# Altium footprint library ICL_komponenty_v1.PcbLib: 160 footprints (part 3 of 10)
Each footprint in its own frame and in the unit in brackets; x right, y up, seen from the top. Pads: shape width x height; smd on the part's side, far side on the other; paste and mask are expansions set on the pad; w line width, h text height; cw(c..) or ccw(c..) is an arc to the next point about the centre after c.
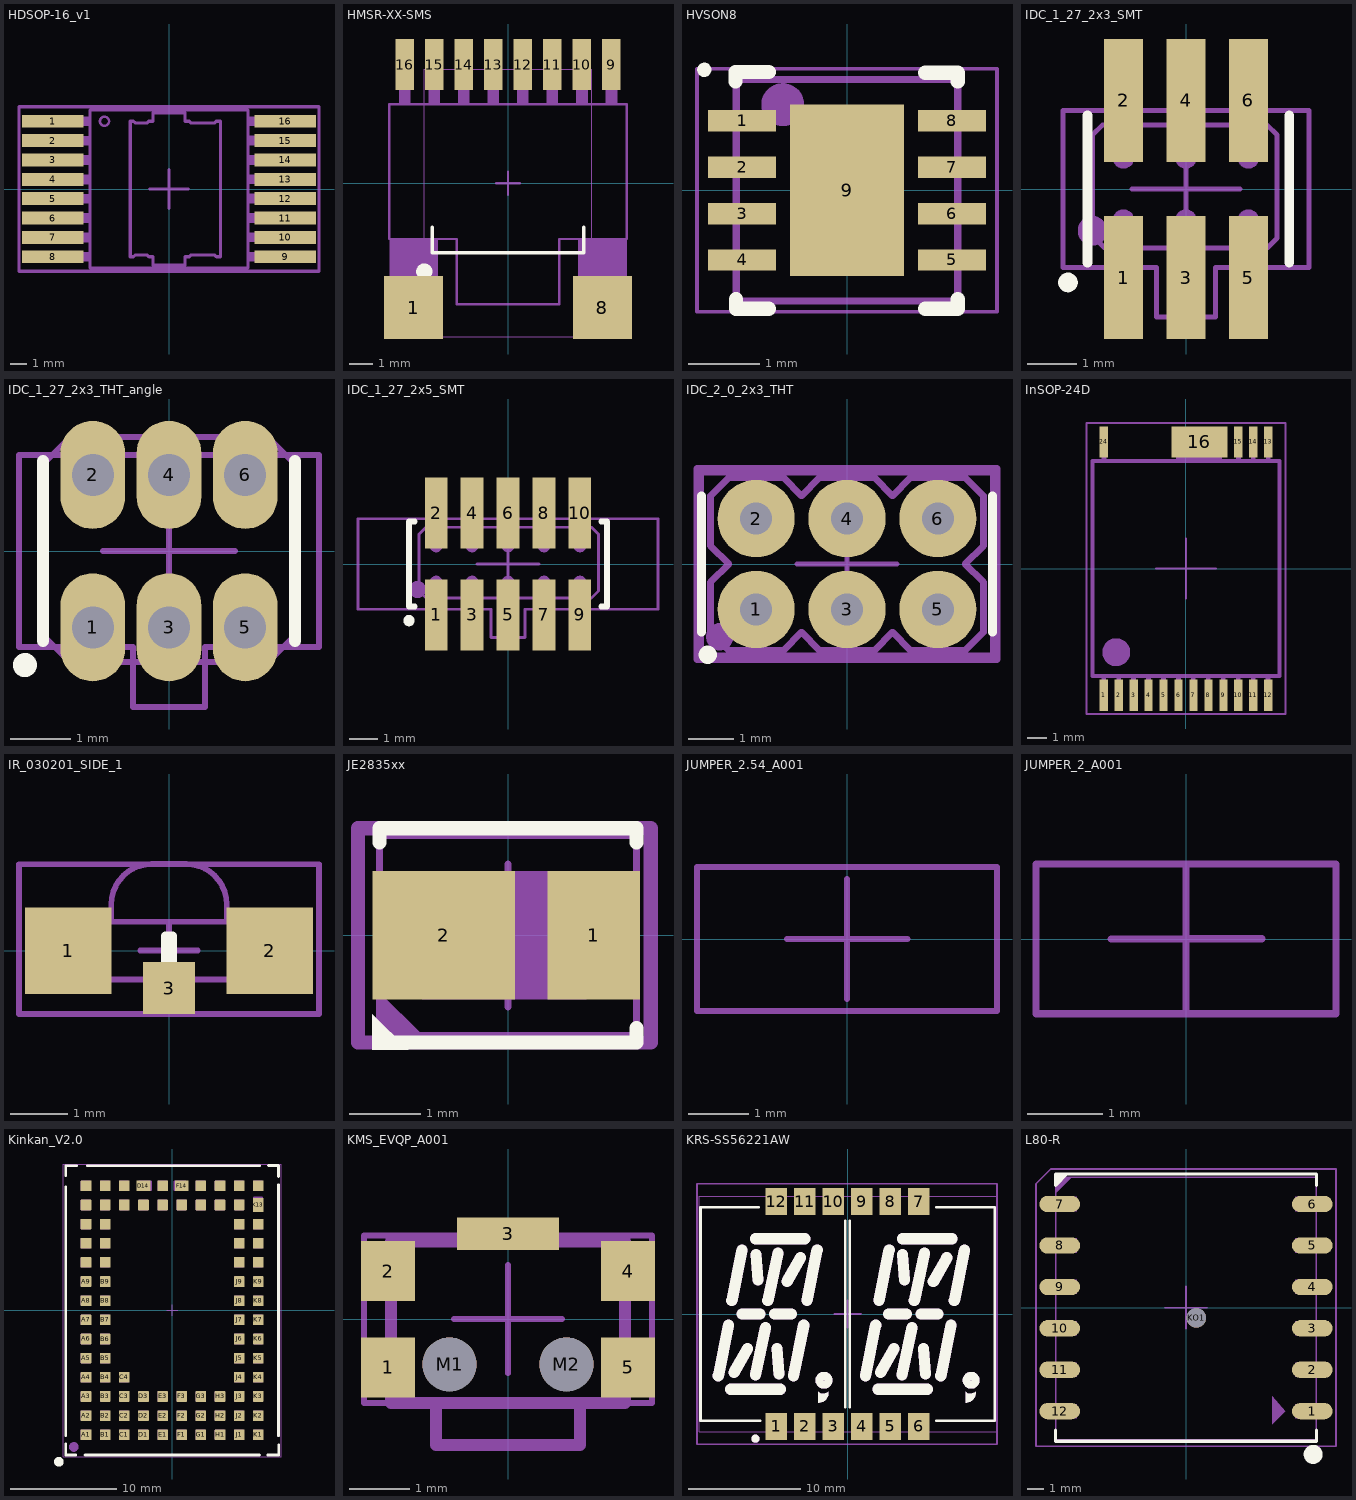
[diagram p2: the footprints below, top view; thin cyan lines are the x and y axes]

## HDSOP-16_v1 [mm] "infinion"
pads (16):
  rect 3.8x0.8 smd: 1(-7.2,4.2) 2(-7.2,3) 3(-7.2,1.8) 4(-7.2,0.6) 5(-7.2,-0.6) 6(-7.2,-1.8) 7(-7.2,-3) 8(-7.2,-4.2) 9(7.2,-4.2) 10(7.2,-3) 11(7.2,-1.8) 12(7.2,-0.6) 13(7.2,0.6) 14(7.2,1.8) 15(7.2,3) 16(7.2,4.2)
Top M11-12_SMOT:
  circle w0.15: c-4,4.2 r0.283
  region: 7.5,4.507 4.9,4.507 4.9,3.9 7.5,3.9
  region: 7.5,3.307 4.9,3.307 4.9,2.7 7.5,2.7
  region: 7.5,2.107 4.9,2.107 4.9,1.5 7.5,1.5
  region: 7.5,0.907 4.9,0.907 4.9,0.3 7.5,0.3
  region: 7.5,-0.293 4.9,-0.293 4.9,-0.9 7.5,-0.9
  region: 7.5,-1.493 4.9,-1.493 4.9,-2.1 7.5,-2.1
  region: 7.5,-2.693 4.9,-2.693 4.9,-3.3 7.5,-3.3
  region: 7.5,-3.893 4.9,-3.893 4.9,-4.5 7.5,-4.5
  rectangle: -7.5,-4.507 -4.9,-3.9
  rectangle: -7.5,-3.307 -4.9,-2.7
  rectangle: -7.5,-2.107 -4.9,-1.5
  rectangle: -7.5,-0.907 -4.9,-0.3
  rectangle: -7.5,0.293 -4.9,0.9
  rectangle: -7.5,1.493 -4.9,2.1
  rectangle: -7.5,2.693 -4.9,3.3
  rectangle: -7.5,3.893 -4.9,4.5
  lines w0.2: -4.9,-4.9 -4.9,4.9 4.9,4.9 4.9,-4.9 -4.9,-4.9 ; -2.4,-4.2 -2.207,-4.2 -2.107,-4.1 -1.347,-4.1 -1.247,-4.2 -1,-4.2 -1,-4.73 1,-4.73 1,-4.2 1.251,-4.2 1.351,-4.1 2.84,-4.1 2.94,-4.2 3.2,-4.2 3.2,4.2 2.933,4.2 2.833,4.1 1.352,4.1 1.252,4.2 1,4.2 1,4.73 -1,4.73 -1,4.2 -1.252,4.2 -1.352,4.1 -2.1,4.1 -2.2,4.2 -2.4,4.2 -2.4,-4.2
Top M15-16_SORG:
  lines w0.2: -1.2,0 0,0 ; 0,-1.2 0,0 ; 0,1.2 0,0 ; 1.2,0 0,0 ; -9.3,-5.1 -9.3,5.1 9.3,5.1 9.3,-5.1 -9.3,-5.1
3D body "PG-HDSOP-16-1.stp": height 2.21, standoff -0.15, extent -7.5,-4.95 7.5,4.95

## HMSR-XX-SMS [mm] "LEM CS"
height 2.39
pads (10):
  rect 2.54x2.7 smd: 1(-4.06,-5.35) 8(4.06,-5.35)
  rect 0.8x2.2 smd: 9(4.445,5.1) 10(3.175,5.1) 11(1.905,5.1) 12(0.635,5.1) 13(-0.635,5.1) 14(-1.905,5.1) 15(-3.175,5.1) 16(-4.445,5.1)
Top Overlay:
  circle w0.35: c-3.6,-3.8 r0.172
  lines w0.152: -3.25,-1.9 -3.25,-3 3.25,-3 3.25,-1.9
Top M11-12_SMOT:
  rectangle: -5.1,-5.1 -3,-2.4
  rectangle: 4.2,3.4 4.7,5.7
  rectangle: 3.02,-5.1 5.12,-2.4
  rectangle: 2.93,3.4 3.43,5.7
  rectangle: 1.66,3.4 2.16,5.7
  rectangle: 0.39,3.4 0.89,5.7
  rectangle: -0.88,3.4 -0.38,5.7
  rectangle: -2.15,3.4 -1.65,5.7
  rectangle: -3.42,3.4 -2.92,5.7
  rectangle: -4.69,3.4 -4.19,5.7
  lines w0.1: -5.1,-2.4 -5.1,3.4 5.1,3.4 5.1,-2.4 2.2,-2.4 2.2,-5.2 0,-5.2 -2.2,-5.2 -2.2,-2.4 -5.1,-2.4
Top M13-14_SDES:
  text "'.Designator'" at -6.165,1.483 h1
Top M15-16_SORG:
  lines w0.05: -3.6,-6.6 3.6,-6.6 3.6,4.9 -3.6,4.9 -3.6,-6.6
  lines w0.1: -0.5,0 0.5,0 ; 0,-0.5 0,0.5
3D body "HMSR-SMS.stp": height 6.46, standoff 0.01, extent -5.16,-6.48 5.16,5.65

## HVSON8 [mm] "SON, 8-Leads, Body 3,00x3,00mm, Pitch 0,65mm, Thermal Pad 2,40x1,59mm, IPC Low Density"
height 1
pads (9):
  rect 0.95x0.3 smd: 1(-1.47,0.975) 2(-1.47,0.325) 3(-1.47,-0.325) 4(-1.47,-0.975) 5(1.47,-0.975) 6(1.47,-0.325) 7(1.47,0.325) 8(1.47,0.975)
  rect 1.59x2.4 smd: 9(0,0)
Top Overlay:
  circle w0.1: c-1.998,1.688 r0.05
  lines w0.2: -1.56,1.525 -1.56,1.657 -1.095,1.657 ; -1.555,-1.525 -1.555,-1.658 -1.095,-1.658 ; 1.095,-1.658 1.551,-1.658 1.551,-1.525 ; 1.095,1.647 1.552,1.647 1.552,1.525
Top M11-12_SMOT:
  circle w0.3: c-0.9,1.2 r0.15
  rectangle: -1.632,0.857 -1.03,1.1
  rectangle: -1.632,0.207 -1.03,0.45
  rectangle: -1.632,-0.443 -1.03,-0.2
  rectangle: -1.632,-1.093 -1.03,-0.85
  region: 1.632,-0.857 1.03,-0.857 1.03,-1.1 1.632,-1.1
  region: 1.632,-0.207 1.03,-0.207 1.03,-0.45 1.632,-0.45
  region: 1.632,0.443 1.03,0.443 1.03,0.2 1.632,0.2
  region: 1.632,1.093 1.03,1.093 1.03,0.85 1.632,0.85
  lines w0.1: -1.55,-1.55 -1.55,1.55 1.55,1.55 1.55,-1.55 -1.55,-1.55
Top M13-14_SDES:
  text "'.Designator'" at 0.292,-3.965 h0.7
Top M15-16_SORG:
  lines w0.05: -2.1,-1.7 -2.1,1.7 2.1,1.7 2.1,-1.7 -2.1,-1.7
  lines w0.1: -0.5,0 0.5,0 ; 0,-0.5 0,0.5
3D body "HVSON8.step": height 1, standoff 0, extent -1.551,-1.55 1.551,1.55

## IDC_1_27_2x3_SMT [mm] "IDC 2x3 1,27 mm SMT OEM"
pads (6):
  rect 0.8x2.5 smd: 1(-1.27,-1.8) 2(-1.27,1.8) 3(0,-1.8) 4(0,1.8) 5(1.27,-1.8) 6(1.27,1.8)
Top Overlay:
  circle w0.2: c-2.4,-1.9 r0.1
  lines w0.2: -2,-1.5 -2,1.5 ; 2.1,-1.5 2.1,1.5
Top M11-12_SMOT:
  circle w0.4: c-1.9,-0.85 r0.1
  circle w0.2: c1.27,-0.635 r0.12
  circle w0.2: c-1.27,-0.635 r0.12
  circle w0.2: c-1.27,0.635 r0.12
  circle w0.2: c1.27,0.635 r0.12
  circle w0.2: c0,-0.635 r0.12
  circle w0.2: c0,0.635 r0.12
  region: -1.052,-0.656 -1.489,-0.656 -1.489,-2.072 -1.052,-2.072
  region: 0.218,-0.656 -0.219,-0.656 -0.219,-2.072 0.218,-2.072
  region: 1.488,-0.656 1.051,-0.656 1.051,-2.072 1.488,-2.072
  rectangle: 1.052,0.656 1.489,2.072
  rectangle: -0.218,0.656 0.219,2.072
  rectangle: -1.488,0.656 -1.051,2.072
  lines w0.1: -1.9,-0.95 -1.9,1.1 -1.7,1.3 1.65,1.3 1.85,1.1 1.85,-1 1.65,-1.2 -1.65,-1.2 -1.9,-0.95
Top M13-14_SDES:
  text "'.Designator'" at -5.665,-0.416 h1
Top M15-16_SORG:
  lines w0.1: -1.1,0 0,0 ; 0,-1.1 0,0 ; 0,1.1 0,0 ; 1.1,0 0,0 ; -2.5,-1.6 -2.5,1.6 2.5,1.6 2.5,-1.6 0.6,-1.6 0.6,-2.6 -0.6,-2.6 -0.6,-1.6 -2.5,-1.6
3D body "2x3_pin_SMT_127_62130621021_B.STEP": height 5.92, standoff 0.01, extent -1.905,-2.5 1.905,2.5

## IDC_1_27_2x3_THT_angle [mm] "IDC 2x3 1,27 mm THT angle"
pads (6):
  oval 1.08x1.8 hole 0.7: 1(-1.27,-1.27) 2(-1.27,1.27) 3(0,-1.27) 4(0,1.27) 5(1.27,-1.27) 6(1.27,1.27)
Top Overlay:
  circle w0.2: c-2.4,-1.9 r0.1
  lines w0.2: -2.1,-1.5 -2.1,1.5 ; 2.1,-1.5 2.1,1.5
Top M15-16_SORG:
  lines w0.1: -1.1,0 0,0 ; 0,-1.1 0,0 ; 0,1.1 0,0 ; 1.1,0 0,0 ; -2.5,-1.6 -2.5,1.6 2.5,1.6 2.5,-1.6 0.6,-1.6 0.6,-2.6 -0.6,-2.6 -0.6,-1.6 -2.5,-1.6
Top M17-18_TDES:
  text "'.Designator'" at -5.665,-0.416 h1
Top M19-20_TMOT:
  circle w0.15: c0,1.27 r0.12
  circle w0.15: c0,-1.27 r0.12
  circle w0.15: c1.27,1.27 r0.12
  circle w0.15: c1.27,-1.27 r0.12
  circle w0.15: c-1.27,1.27 r0.12
  circle w0.15: c-1.27,-1.27 r0.12
  lines w0.1: -2.1,-1.4 -1.65,-1.85 1.65,-1.85 2.1,-1.4 2.1,1.45 1.65,1.9 -1.65,1.9 -2.1,1.45 -2.1,-1.4 ; -1.57,-1.47 -1.57,-1.07 -1.47,-0.97 -1.07,-0.97 -0.97,-1.07 -0.97,-1.47 -1.07,-1.57 -1.47,-1.57 -1.57,-1.47 ; -1.57,1.07 -1.57,1.47 -1.47,1.57 -1.07,1.57 -0.97,1.47 -0.97,1.07 -1.07,0.97 -1.47,0.97 -1.57,1.07 ; -0.3,-1.47 -0.3,-1.07 -0.2,-0.97 0.2,-0.97 0.3,-1.07 0.3,-1.47 0.2,-1.57 -0.2,-1.57 -0.3,-1.47 ; -0.3,1.07 -0.3,1.47 -0.2,1.57 0.2,1.57 0.3,1.47 0.3,1.07 0.2,0.97 -0.2,0.97 -0.3,1.07 ; 0.97,-1.47 0.97,-1.07 1.07,-0.97 1.47,-0.97 1.57,-1.07 1.57,-1.47 1.47,-1.57 1.07,-1.57 0.97,-1.47 ; 0.97,1.07 0.97,1.47 1.07,1.57 1.47,1.57 1.57,1.47 1.57,1.07 1.47,0.97 1.07,0.97 0.97,1.07

## IDC_1_27_2x5_SMT [mm] "IDC 2x5 1,27 mm SMT OEM"
pads (10):
  rect 0.8x2.5 smd: 1(-2.54,-1.8) 2(-2.54,1.8) 3(-1.27,-1.8) 4(-1.27,1.8) 5(0,-1.8) 6(0,1.8) 7(1.27,-1.8) 8(1.27,1.8) 9(2.54,-1.8) 10(2.54,1.8)
Top Overlay:
  circle w0.2: c-3.5,-2 r0.1
  lines w0.2: -3.3,-1.5 -3.5,-1.5 -3.5,1.5 -3.3,1.5 ; 3.3,-1.5 3.5,-1.5 3.5,1.5 3.3,1.5
Top M11-12_SMOT:
  circle w0.2: c-2.54,-0.635 r0.12
  circle w0.2: c-2.54,0.635 r0.12
  circle w0.2: c2.54,0.635 r0.12
  circle w0.2: c2.54,-0.635 r0.12
  circle w0.2: c0,0.635 r0.12
  circle w0.2: c0,-0.635 r0.12
  circle w0.2: c1.27,0.635 r0.12
  circle w0.2: c-1.27,0.635 r0.12
  circle w0.2: c-1.27,-0.635 r0.12
  circle w0.2: c1.27,-0.635 r0.12
  circle w0.4: c-3.2,-0.9 r0.1
  region: -2.322,-0.656 -2.759,-0.656 -2.759,-2.072 -2.322,-2.072
  rectangle: -2.758,0.656 -2.321,2.072
  rectangle: 2.322,0.656 2.759,2.072
  region: 2.758,-0.656 2.321,-0.656 2.321,-2.072 2.758,-2.072
  rectangle: -1.488,0.656 -1.051,2.072
  rectangle: -0.218,0.656 0.219,2.072
  rectangle: 1.052,0.656 1.489,2.072
  region: 1.488,-0.656 1.051,-0.656 1.051,-2.072 1.488,-2.072
  region: 0.218,-0.656 -0.219,-0.656 -0.219,-2.072 0.218,-2.072
  region: -1.052,-0.656 -1.489,-0.656 -1.489,-2.072 -1.052,-2.072
  lines w0.1: -3.15,-0.95 -2.9,-1.2 2.95,-1.2 3.2,-0.95 3.2,1.05 2.95,1.3 -2.9,1.3 -3.15,1.05 -3.15,-0.95
Top M13-14_SDES:
  text "'.Designator'" at -5.665,-0.416 h1
Top M15-16_SORG:
  lines w0.1: -1.1,0 0,0 ; 0,-1.1 0,0 ; 0,1.1 0,0 ; 1.1,0 0,0 ; -5.3,-1.6 -5.3,1.6 5.3,1.6 5.3,-1.6 0.6,-1.6 0.6,-2.6 -0.6,-2.6 -0.6,-1.6 -5.3,-1.6
3D body "1_27_2x5_62101021021 (rev1).stp": height 5.92, standoff 0.01, extent -3.175,-2.5 3.175,2.5

## IDC_2_0_2x3_THT [mm] "IDC 2x3 2mm THT"
pads (6):
  round 1.7 hole 0.7: 1(-2,-1) 2(-2,1) 3(0,-1) 4(0,1) 5(2,-1) 6(2,1)
Top Overlay:
  circle w0.2: c-3.064,-1.997 r0.1
  lines w0.2: -3.2,-1.5 -3.2,1.5 ; 3.2,-1.5 3.2,1.5
Top M15-16_SORG:
  lines w0.1: -1.1,0 0,0 ; 0,-1.1 0,0 ; 0,1.1 0,0 ; 1.1,0 0,0 ; -3.2,-2 -3.2,2 3.2,2 3.2,-2 0.6,-2 -3.2,-2
Top M17-18_TDES:
  text "'.Designator'" at -5.465,2.483 h1
Top M19-20_TMOT:
  circle w0.3: c-2.8,-1.6 r0.15
  lines w0.1: -2.4,-1.4 -1.6,-0.6 ; -2.4,-0.6 -1.6,-1.4 ; -2.4,0.6 -1.6,1.4 ; -2.4,1.4 -1.6,0.6 ; -0.4,-1.4 0.4,-0.6 ; -0.4,-0.6 0.4,-1.4 ; -0.4,0.6 0.4,1.4 ; -0.4,1.4 0.4,0.6 ; 1.6,-1.4 2.4,-0.6 ; 1.6,-0.6 2.4,-1.4 ; 1.6,0.6 2.4,1.4 ; 1.6,1.4 2.4,0.6
  lines w0.15: -3.3,-2.1 3.3,-2.1 3.3,2.1 -3.3,2.1 -3.3,-2.1 ; -3,-1.5 -3,-0.4 -2.6,0 -3,0.4 -3,1.5 -2.6,1.9 -1.4,1.9 -1,1.5 -0.6,1.9 0.6,1.9 1,1.5 1.4,1.9 2.6,1.9 3,1.5 3,0.4 2.6,0 3,-0.4 3,-1.5 2.6,-1.9 1.4,-1.9 1,-1.5 0.6,-1.9 -0.6,-1.9 -1,-1.5 -1.4,-1.9 -2.6,-1.9 -3,-1.5 ; -2.4,-1.4 -1.6,-1.4 -1.6,-0.6 -2.4,-0.6 -2.4,-1.4 ; -2.4,0.6 -1.6,0.6 -1.6,1.4 -2.4,1.4 -2.4,0.6 ; -0.4,-1.4 0.4,-1.4 0.4,-0.6 -0.4,-0.6 -0.4,-1.4 ; -0.4,0.6 0.4,0.6 0.4,1.4 -0.4,1.4 -0.4,0.6 ; 1.6,-1.4 2.4,-1.4 2.4,-0.6 1.6,-0.6 1.6,-1.4 ; 1.6,0.6 2.4,0.6 2.4,1.4 1.6,1.4 1.6,0.6
3D body "IDC_2x3_2mm_THT_v1c.STEP": height 6.15, standoff -2.55, extent -3,-2 3,2

## InSOP-24D [mm] "Power Integration"
pads (17):
  rect 0.41x1.58 smd: 1(-4.125,-6.35) 2(-3.375,-6.35) 3(-2.625,-6.35) 4(-1.875,-6.35) 5(-1.125,-6.35) 6(-0.375,-6.35) 7(0.375,-6.35) 8(1.125,-6.35) 9(1.875,-6.35) 10(2.625,-6.35) 11(3.375,-6.35) 12(4.125,-6.35) 13(4.125,6.35) 14(3.375,6.35) 15(2.625,6.35) 24(-4.125,6.35)
  rect 2.81x1.58 smd: 16(0.675,6.35)
Top M11-12_SMOT:
  circle w0.7: c-3.5,-4.2 r0.35
  rectangle: -4.237,5.4 -4,6.7
  rectangle: 2.513,5.4 2.75,6.7
  rectangle: 3.263,5.4 3.5,6.7
  rectangle: 4.013,5.4 4.25,6.7
  region: -4.013,-5.4 -4.25,-5.4 -4.25,-6.7 -4.013,-6.7
  region: -3.263,-5.4 -3.5,-5.4 -3.5,-6.7 -3.263,-6.7
  region: -2.513,-5.4 -2.75,-5.4 -2.75,-6.7 -2.513,-6.7
  region: -1.763,-5.4 -2,-5.4 -2,-6.7 -1.763,-6.7
  region: -1.013,-5.4 -1.25,-5.4 -1.25,-6.7 -1.013,-6.7
  region: -0.263,-5.4 -0.5,-5.4 -0.5,-6.7 -0.263,-6.7
  region: 0.487,-5.4 0.25,-5.4 0.25,-6.7 0.487,-6.7
  region: 1.237,-5.4 1,-5.4 1,-6.7 1.237,-6.7
  region: 1.987,-5.4 1.75,-5.4 1.75,-6.7 1.987,-6.7
  region: 2.737,-5.4 2.5,-5.4 2.5,-6.7 2.737,-6.7
  region: 3.487,-5.4 3.25,-5.4 3.25,-6.7 3.487,-6.7
  region: 4.237,-5.4 4,-5.4 4,-6.7 4.237,-6.7
  rectangle: -0.5,5.4 1.8,6.7
  lines w0.2: -4.7,-5.4 4.7,-5.4 4.7,5.4 -4.7,5.4 -4.7,-5.4
Top M13-14_SDES:
  text "'.Designator'" at 0.292,-3.965 h0.7
Top M15-16_SORG:
  lines w0.1: -1.5,0 0,0 ; 0,-1.5 0,0 ; 0,1.5 0,0 ; 1.5,0 0,0 ; -5,-7.3 5,-7.3 5,7.3 -5,7.3 -5,-7.3
3D body "SOP127P600-8M2.STEP": height 1.61, standoff 0.01, extent -4.75,-6.72 4.75,6.72

## IR_030201_SIDE_1 [mm] "IR emiter side right"
height 0.381
pads (3):
  rect 1.5x1.5 smd: 1(-1.75,0) 2(1.75,0)
  rect 0.9x0.9 smd: 3(0,-0.65)
Top Overlay:
  circle w0.25: c-1.7,0 r0.1
  lines w0.152: -0.064,-0.254 -0.064,0.254 0.064,0.254 0.064,-0.254 -0.064,-0.254
Top M11-12_SMOT:
  rectangle: -1.5,-0.5 -1.164,0.5
  region: 1.5,0.5 1.164,0.5 1.164,-0.5 1.5,-0.5
  rectangle: -0.4,-0.5 0.4,-0.2
  lines w0.1: -1,0.506 -1,0.8 cw(c-0.3,0.8) -0.3,1.5 0.3,1.5 cw(c0.3,0.8) 1,0.8 1,0.508 ; -1.5,-0.5 -1.5,0.5 1.5,0.5 1.5,-0.5 -1.5,-0.5
Top M13-14_SDES:
  text "'.Designator'" at -2.832,1.792 h0.5
Top M15-16_SORG:
  lines w0.1: -0.5,0 0.5,0 ; 0,-0.5 0,0.5 ; -2.6,-1.1 2.6,-1.1 2.6,1.497 -2.6,1.497 -2.6,-1.1
3D body "KPA-3010F3C.stp": height 1.01, standoff 0.01, extent -1.5,-0.51 1.5,1.5

## JE2835xx [mm] "cree led"
pads (2):
  rect 1.3x1.8 smd: 1(1.2,0)
  rect 2x1.8 smd: 2(-0.9,0)
Top Overlay:
  region: -1.9,-1.1 -1.4,-1.6 -1.9,-1.6
  lines w0.2: -1.8,-1.5 1.8,-1.5 1.8,-1.3 ; -1.8,1.3 -1.8,1.5 1.8,1.5 1.8,1.3
Top M11-12_SMOT:
  region: 1.1,0.9 -1.202,0.9 -1.202,-0.9 1.1,-0.9
  region: -1.8,-0.795 -1.209,-1.386 -1.209,-1.4 -1.8,-1.4
  lines w0.1: -1.8,-1.4 -1.8,1.4 1.8,1.4 1.8,-1.4 -1.8,-1.4
Top M13-14_SDES:
  text "'.Designator'" at -4.532,-0.333 h0.8
Top M15-16_SORG:
  lines w0.1: -1,0 0,0 ; 0,-1 0,0 ; 0,1 0,0 ; 1,0 0,0
  lines w0.2: -2.1,-1.5 2,-1.5 2,1.5 -2.1,1.5 -2.1,-1.5
3D body "J-2835_v5.stp": height 0.71, standoff 0.01, extent -1.781,-1.379 1.759,1.401

## JUMPER_2.54_A001 [mm]
Top M15-16_SORG:
  lines w0.1: -1,0 0,0 ; 0,-1 0,0 ; 0,1 0,0 ; 0.009,0.004 1.009,0.004 ; -2.5,-1.2 -2.5,1.2 2.5,1.2 2.5,-1.2 -2.5,-1.2
3D body "pin_head_2_54mm_black.stp": height 8.99, standoff 3.01, extent -2.5,-1.22 2.5,1.22

## JUMPER_2_A001 [mm]
Top M15-16_SORG:
  lines w0.1: -1,0 0,0 ; 0,-1 0,0 ; 0,1 0,0 ; 0.009,0.004 1.009,0.004 ; -2,-0.999 -2,1 2,1 2,-0.999 -2,-0.999
3D body "jumper_2mm_60800213421.stp": height 5.95, standoff 2.45, extent -2.025,-0.95 2.025,0.95

## Kinkan_V2.0 [mm]
pads (87):
  rrect10% 1x1 smd paste+0.025 mask+0.1: A1(-8.1,-11.7) A2(-8.1,-9.9) A3(-8.1,-8.1) A4(-8.1,-6.3) A5(-8.1,-4.5) A6(-8.1,-2.7) A7(-8.1,-0.9) A8(-8.1,0.9) A9(-8.1,2.7) A10(-8.1,4.5) A11(-8.1,6.3) A12(-8.1,8.1) A13(-8.1,9.9) A14(-8.1,11.7) B1(-6.3,-11.7) B2(-6.3,-9.9) B3(-6.3,-8.1) B4(-6.3,-6.3) B5(-6.3,-4.5) B6(-6.3,-2.7) B7(-6.3,-0.9) B8(-6.3,0.9) B9(-6.3,2.7) B10(-6.3,4.5) B11(-6.3,6.3) B12(-6.3,8.1) B13(-6.3,9.9) B14(-6.3,11.7) C1(-4.5,-11.7) C2(-4.5,-9.9) C3(-4.5,-8.1) C4(-4.5,-6.3) C13(-4.5,9.9) C14(-4.5,11.7) D1(-2.7,-11.7) D2(-2.7,-9.9) D3(-2.7,-8.1) D13(-2.7,9.9) E1(-0.9,-11.7) E2(-0.9,-9.9) E3(-0.9,-8.1) E13(-0.9,9.9) E14(-0.9,11.7) F1(0.9,-11.7) F2(0.9,-9.9) F3(0.9,-8.1) F13(0.9,9.9) G1(2.7,-11.7) G2(2.7,-9.9) G3(2.7,-8.1) G13(2.7,9.9) G14(2.7,11.7) H1(4.5,-11.7) H2(4.5,-9.9) H3(4.5,-8.1) H13(4.5,9.9) H14(4.5,11.7) J1(6.3,-11.7) J2(6.3,-9.9) J3(6.3,-8.1) J4(6.3,-6.3) J5(6.3,-4.5) J6(6.3,-2.7) J7(6.3,-0.9) J8(6.3,0.9) J9(6.3,2.7) J10(6.3,4.5) J11(6.3,6.3) J12(6.3,8.1) J13(6.3,9.9) J14(6.3,11.7) K1(8.1,-11.7) K2(8.1,-9.9) K3(8.1,-8.1) K4(8.1,-6.3) K5(8.1,-4.5) K6(8.1,-2.7) K7(8.1,-0.9) K8(8.1,0.9) K9(8.1,2.7) K10(8.1,4.5) K11(8.1,6.3) K12(8.1,8.1) K14(8.1,11.7)
  rrect10% 1.3x1 smd paste+0.025 mask+0.1: D14(-2.7,11.7) F14(0.9,11.7)
  rrect10% 1x1.3 smd paste+0.025 mask+0.1: K13(8.1,9.9)
Top Overlay:
  circle w0.5: c-10.65,-14.25 r0.2
  lines w0.25: -10.01,12.66 -10.01,13.6 -8.97,13.6 ; -10,-12.57 -10,-13.61 -9.06,-13.61 ; -10,-11.8 -10,11.6 ; -8.2,-13.6 8.2,-13.6 ; -8,13.6 8.2,13.6 ; 8.97,-13.6 10.01,-13.6 10.01,-12.66 ; 9.06,13.61 10,13.61 10,12.57 ; 10,-11.8 10,11.8
Top M11-12_SMOT:
  circle w0.5: c-9.25,-12.85 r0.2
  lines w0.1: -10.25,-13.75 10.25,-13.75 10.25,13.75 -10.25,13.75 -10.25,-13.75
Bottom M13-14_SDES:
  drawing of 349 lines, arcs and shapes, not listed
  text ".Designator" at -3.5,7 h1.52
Top M15-16_SORG:
  lines w0.05: -0.5,0 0.5,0 ; 0,-0.5 0,0.5
3D body "8DEV_8100_0002.step": height 2, standoff 0, extent -9.75,-13.35 9.75,13.35

## KMS_EVQP_A001 [mm] "microwsitch SMD angle"
pads (7):
  rect 0.9x1 smd mask+0.1: 1(-2,-0.8) 2(-2,0.8) 4(2,0.8) 5(2,-0.8)
  rect 1.7x0.55 smd mask+0.1: 3(0,1.425)
  round 0.9 hole 0.9 unplated mask+0.1: M1(-0.975,-0.75) M2(0.975,-0.75)
Top M11-12_SMOT:
  region: 0.6,1.3 0.6,1.55 -0.6,1.55 -0.6,1.3
  region: -1.95,1.2 -2.3,1.2 -2.3,0.4 -1.95,0.4
  region: -1.95,-0.4 -2.3,-0.4 -2.3,-1.2 -1.95,-1.2
  rectangle: 1.95,-1.2 2.3,-0.4
  rectangle: 1.95,0.4 2.3,1.2
  lines w0.2: -1.2,-1.4 -1.2,-2.1 1.2,-2.1 1.2,-1.4 ; -1.95,-1.4 -1.95,1.3 1.95,1.3 1.95,-1.4 -1.95,-1.4
Top M13-14_SDES:
  text "'.Designator'" at -4.532,-0.333 h0.8
Top M15-16_SORG:
  lines w0.1: -1.2,-1.4 -1.2,-2.1 1.2,-2.1 1.2,-1.4 ; -0.9,0 0,0 ; 0,-0.9 0,0 ; 0,0.9 0,0 ; 0.9,0 0,0 ; -2.4,-1.4 -2.4,1.4 2.4,1.4 2.4,-1.4 -2.4,-1.4
3D body "KMS231G.X_T": height 1.43, standoff -0.01, extent -2.3,-2.15 2.3,1.4
3D body "EVQP7-JA-01P_v2.step": height 1.36, standoff 0.01, extent -2.35,-2.1 2.35,1.45

## KRS-SS56221AW [mm] "led display 16 segment"
pads (12):
  rect 1.9x2.4 smd: 1(-6.35,-10) 2(-3.81,-10) 3(-1.27,-10) 4(1.27,-10) 5(3.81,-10) 6(6.35,-10) 7(6.35,10) 8(3.81,10) 9(1.27,10) 10(-1.27,10) 11(-3.81,10) 12(-6.35,10)
Top Overlay:
  circle w0.508: c-8.2,-11.1 r0.105
  circle w0.7: c11,-5.9 r0.4
  circle w0.7: c-2.1,-5.9 r0.4
  region: -2.6,-6.9 -2.6,-7.9 -2.511,-7.9 -2.337,-7.865 -2.174,-7.798 -2.026,-7.699 -1.901,-7.574 -1.802,-7.426 -1.735,-7.263 -1.7,-7.089 -1.7,-7 -1.7,-6.9 -1.75,-6.945 -1.861,-7.019 -1.985,-7.071 -2.116,-7.097 -2.183,-7.1 -2.2,-7.1 -2.247,-7.098 -2.34,-7.079 -2.428,-7.043 -2.506,-6.99 -2.541,-6.959
  region: 10.5,-6.9 10.5,-7.9 10.589,-7.9 10.763,-7.865 10.926,-7.798 11.074,-7.699 11.199,-7.574 11.298,-7.426 11.365,-7.263 11.4,-7.089 11.4,-7 11.4,-6.9 11.35,-6.945 11.239,-7.019 11.115,-7.071 10.984,-7.097 10.917,-7.1 10.9,-7.1 10.853,-7.098 10.76,-7.079 10.672,-7.043 10.594,-6.99 10.559,-6.959
  lines w0.25: -7.9,9.5 -13.1,9.5 -13.1,-9.5 -7.8,-9.5 ; -0.2,-8.3 -0.2,8.3 ; 0.2,-8.3 0.2,8.3 ; 7.9,-9.5 13.1,-9.5 13.1,9.5 7.9,9.5
  lines w1: -11.5,-5.5 -10.6,-1 ; -10.4,-6.7 -6,-6.7 ; -10.3,1.2 -9.4,5.7 ; -10.1,-5.2 -8.9,-3.1 ; -9.386,0 -7.817,0 ; -8.2,-5.4 -7.3,-1.2 ; -8.2,6.7 -3.8,6.7 ; -8.154,5.296 -7.978,3.017 ; -7.1,1.2 -6.2,5.4 ; -6.5,0 -5,0 ; -6.272,-3.07 -6.096,-5.349 ; -5.4,2.9 -4.2,5 ; -4.8,-5.5 -3.9,-1 ; -3.6,1.2 -2.7,5.7 ; 1.6,-5.5 2.5,-1 ; 2.7,-6.7 7.1,-6.7 ; 2.8,1.2 3.7,5.7 ; 2.936,-5.2 4.136,-3.1 ; 3.651,0 5.219,0 ; 4.836,-5.4 5.736,-1.2 ; 4.883,5.296 5.058,3.017 ; 4.9,6.7 9.3,6.7 ; 5.936,1.2 6.836,5.4 ; 6.536,0 8.036,0 ; 6.765,-3.07 6.94,-5.349 ; 7.636,2.9 8.836,5 ; 8.3,-5.5 9.2,-1 ; 9.5,1.2 10.4,5.7
Top M11-12_SMOT:
  circle w0.508: c-8.2,-11.1 r0.114
  circle w0.7: c-2.1,-5.9 r0.4
  circle w0.7: c11,-5.9 r0.4
  region: -5.6,-10.5 -5.6,-8.9 -7.1,-8.9 -7.1,-10.5
  region: -3.06,-10.5 -3.06,-8.9 -4.56,-8.9 -4.56,-10.5
  region: -0.52,-10.5 -0.52,-8.9 -2.02,-8.9 -2.02,-10.5
  region: 2.02,-10.5 2.02,-8.9 0.52,-8.9 0.52,-10.5
  region: 4.56,-10.5 4.56,-8.9 3.06,-8.9 3.06,-10.5
  region: 7.1,-10.5 7.1,-8.9 5.6,-8.9 5.6,-10.5
  region: 5.6,10.5 5.6,8.9 7.1,8.9 7.1,10.5
  region: 3.06,10.5 3.06,8.9 4.56,8.9 4.56,10.5
  region: 0.52,10.5 0.52,8.9 2.02,8.9 2.02,10.5
  region: -2.02,10.5 -2.02,8.9 -0.52,8.9 -0.52,10.5
  region: -4.56,10.5 -4.56,8.9 -3.06,8.9 -3.06,10.5
  region: -7.1,10.5 -7.1,8.9 -5.6,8.9 -5.6,10.5
  region: -2.6,-6.9 -2.6,-7.9 -2.511,-7.9 -2.337,-7.865 -2.174,-7.798 -2.026,-7.699 -1.901,-7.574 -1.802,-7.426 -1.735,-7.263 -1.7,-7.089 -1.7,-7 -1.7,-6.9 -1.75,-6.945 -1.861,-7.019 -1.985,-7.071 -2.116,-7.097 -2.183,-7.1 -2.2,-7.1 -2.247,-7.098 -2.34,-7.079 -2.428,-7.043 -2.506,-6.99 -2.541,-6.959
  region: 10.5,-6.9 10.5,-7.9 10.589,-7.9 10.763,-7.865 10.926,-7.798 11.074,-7.699 11.199,-7.574 11.298,-7.426 11.365,-7.263 11.4,-7.089 11.4,-7 11.4,-6.9 11.35,-6.945 11.239,-7.019 11.115,-7.071 10.984,-7.097 10.917,-7.1 10.9,-7.1 10.853,-7.098 10.76,-7.079 10.672,-7.043 10.594,-6.99 10.559,-6.959
  lines w0.1: -13.2,-10.5 13.3,-10.5 13.3,10.5 -13.2,10.5 -13.2,-10.5
  lines w1: -11.5,-5.5 -10.6,-1 ; -10.4,-6.7 -6,-6.7 ; -10.3,1.2 -9.4,5.7 ; -10.1,-5.2 -8.9,-3.1 ; -9.386,0 -7.817,0 ; -8.2,-5.4 -7.3,-1.2 ; -8.2,6.7 -3.8,6.7 ; -8.154,5.296 -7.978,3.017 ; -7.1,1.2 -6.2,5.4 ; -6.5,0 -5,0 ; -6.272,-3.07 -6.096,-5.349 ; -5.4,2.9 -4.2,5 ; -4.8,-5.5 -3.9,-1 ; -3.6,1.2 -2.7,5.7 ; 1.6,-5.5 2.5,-1 ; 2.7,-6.7 7.1,-6.7 ; 2.8,1.2 3.7,5.7 ; 2.936,-5.2 4.136,-3.1 ; 3.651,0 5.219,0 ; 4.836,-5.4 5.736,-1.2 ; 4.883,5.296 5.058,3.017 ; 4.9,6.7 9.3,6.7 ; 5.936,1.2 6.836,5.4 ; 6.536,0 8.036,0 ; 6.765,-3.07 6.94,-5.349 ; 7.636,2.9 8.836,5 ; 8.3,-5.5 9.2,-1 ; 9.5,1.2 10.4,5.7
Top M13-14_SDES:
  text "'.Designator'" at -11.23,12.767 h2
Top M15-16_SORG:
  lines w0.15: -1.194,0 0,0 ; 0,-1.194 0,0 ; 0,1.194 0,0 ; 1.194,0 0,0 ; -13.4,-11.6 13.3,-11.6 13.3,11.6 -13.4,11.6 -13.4,-11.6
3D body "display_1.stp": height 3.77, standoff 0.01, extent -13.25,-10.5 13.25,10.5

## L80-R [mm]
pads (13):
  oval 2.5x1 smd mask+0.1: 1(7.75,-6.35) 2(7.75,-3.81) 3(7.75,-1.27) 4(7.75,1.27) 5(7.75,3.81) 6(7.75,6.35) 7(-7.75,6.35) 8(-7.75,3.81) 9(-7.75,1.27) 10(-7.75,-1.27) 11(-7.75,-3.81) 12(-7.75,-6.35)
  round 1.2 hole 1.2 unplated mask+0.1: KO1(0.63,-0.63)
Top Overlay:
  circle w0.6: c7.8,-9 r0.283
  region: -8,8.2 -7.3,8.2 -8,7.5
  lines w0.1: -7.3,8.2 -6.8,8.2
  lines w0.2: -8,-7.5 -8,-8.2 8,-8.2 8,-7.5 ; -7.3,8.2 -8,7.5 -8,8.2 8,8.2 8,7.5
Top M11-12_SMOT:
  region: -6.7,-0.82 -8.2,-0.82 -8.2,-1.72 -6.7,-1.72
  region: -6.7,1.72 -8.2,1.72 -8.2,0.82 -6.7,0.82
  region: -6.7,-3.36 -8.2,-3.36 -8.2,-4.26 -6.7,-4.26
  region: -6.7,-5.9 -8.2,-5.9 -8.2,-6.8 -6.7,-6.8
  region: -6.7,6.8 -8.2,6.8 -8.2,5.9 -6.7,5.9
  region: -6.7,4.26 -8.2,4.26 -8.2,3.36 -6.7,3.36
  rectangle: 6.7,-1.72 8.2,-0.82
  rectangle: 6.7,0.82 8.2,1.72
  rectangle: 6.7,-6.8 8.2,-5.9
  rectangle: 6.7,-4.26 8.2,-3.36
  rectangle: 6.7,3.36 8.2,4.26
  rectangle: 6.7,5.9 8.2,6.8
  region: -8,8 -7,8 -8,7
  region: 5.3,-5.45 5.3,-7.15 6.1,-6.35
  lines w0.1: -8,-8.1 -8,8 8,8 8,-8.1 -8,-8.1
Top M13-14_SDES:
  text "'.Designator'" at -0.583,7.931 h1.4
Top M15-16_SORG:
  lines w0.1: -1.3,0 0,0 ; 0,-1.3 0,0 ; 0,1.3 0,0 ; 1.3,0 0,0 ; -9.2,-8.5 9.2,-8.5 9.2,8.5 -8.3,8.5 -9.2,7.6 -9.2,-8.5
3D body "quectel-l80.step": height 6.96, standoff 0.01, extent -8,-8 8,8